# Altium footprint library ICs And Semiconductors SMD.PcbLib: 602 footprints (part 8 of 38)
Each footprint in its own frame and in the unit in brackets; x right, y up, seen from the top. Pads: shape width x height; smd on the part's side, far side on the other; paste and mask are expansions set on the pad; w line width, h text height; cw(c..) or ccw(c..) is an arc to the next point about the centre after c.
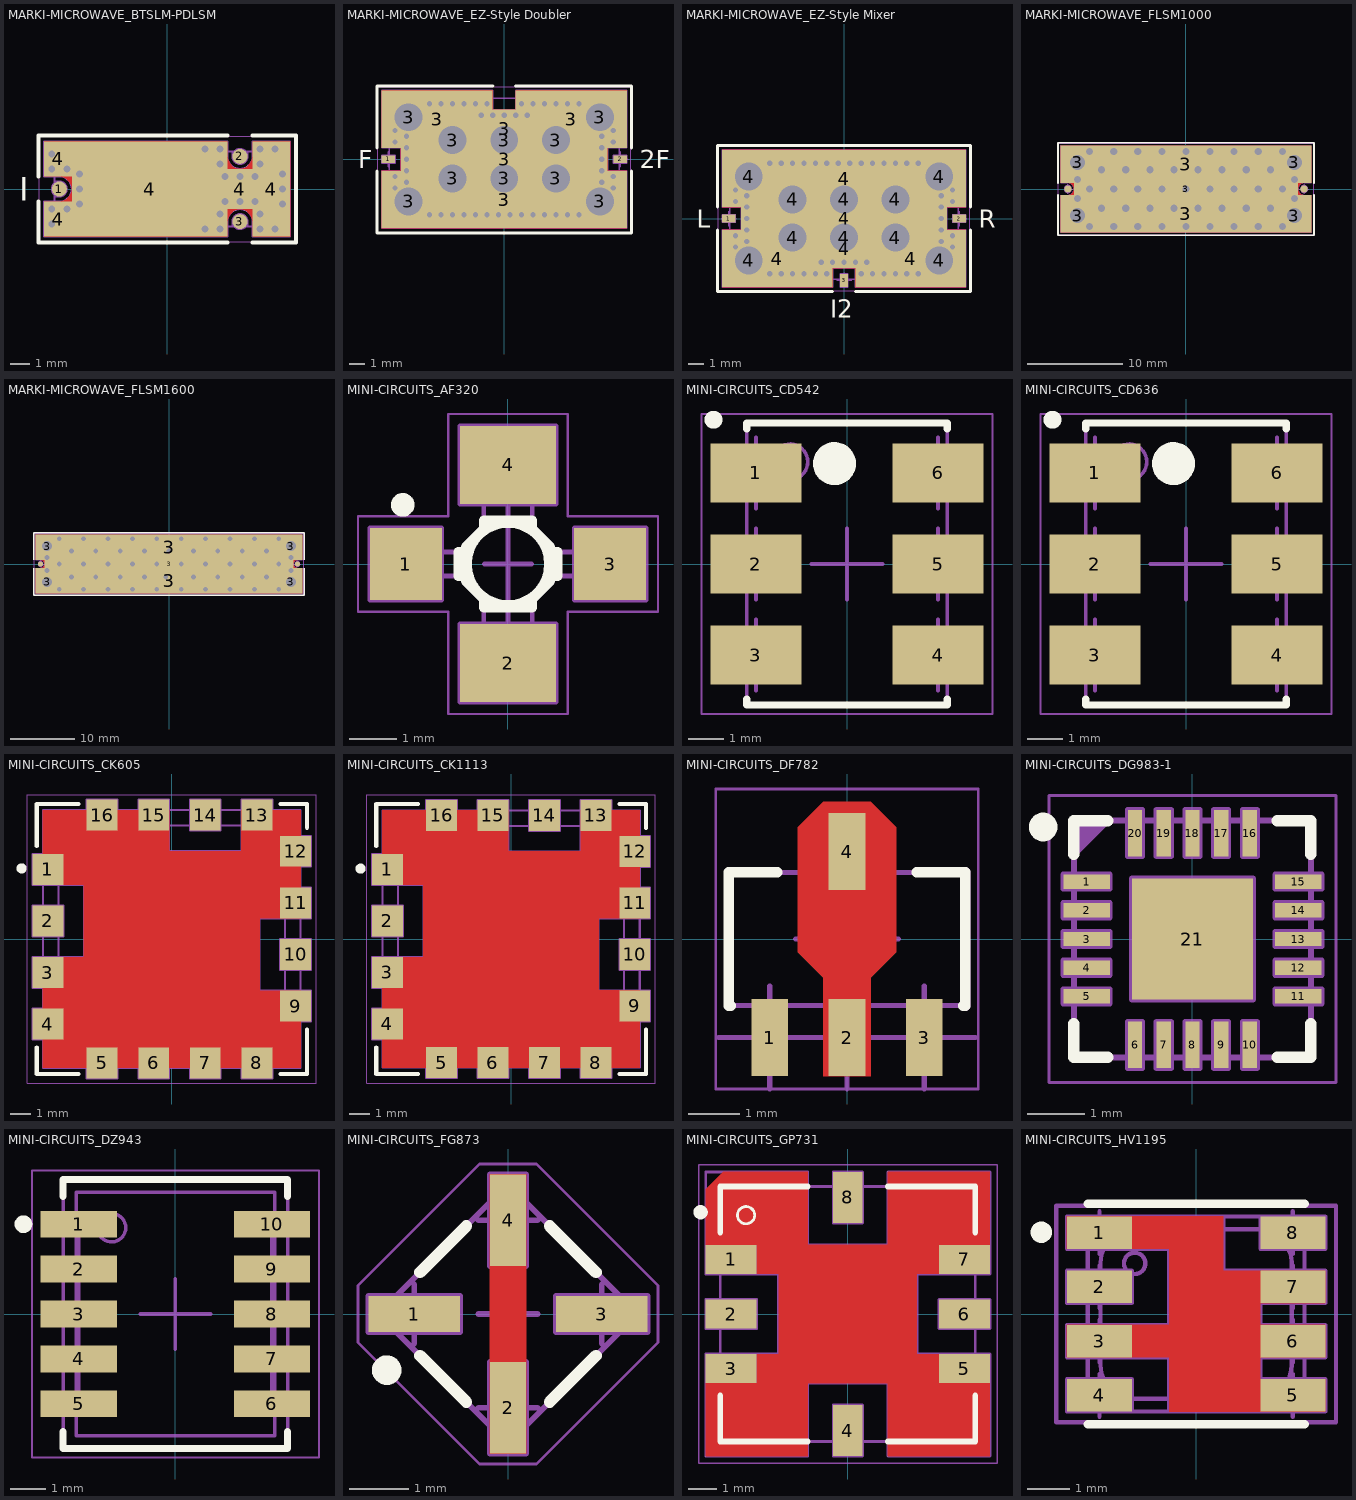
[diagram p7: the footprints below, top view; thin cyan lines are the x and y axes]

## MARKI-MICROWAVE_BTSLM-PDLSM [mil] "Marki microwave BTSLM-PDLSM Style, 11.43mm L X 3.81mm W X 2.79mm H Body"
height 169.29
pads (8):
  round 30 smd: 1(-215,0) 2(145.08,65) 3(145.08,-65)
  rect 54.96x70 smd: 4(-217.52,-59.98) 4(-217.52,60)
  rect 310.04x190 smd: 4(-35.02,0)
  rect 50x80.08 smd: 4(145,0)
  rect 74.96x190 smd: 4(207.51,-0.03)
via 75,80 diameter 23.62 hole 13.78
via 105,80 diameter 23.62 hole 13.78
via 105,50 diameter 23.62 hole 13.78
via 115,25 diameter 23.62 hole 13.78
via 145,25 diameter 23.62 hole 13.78
via 175,25 diameter 23.62 hole 13.78
via 185,50 diameter 23.62 hole 13.78
via 185,80 diameter 23.62 hole 13.78
via 215,80 diameter 23.62 hole 13.78
via 230,30 diameter 23.62 hole 13.78
via 230,0 diameter 23.62 hole 13.78
via 230,-30 diameter 23.62 hole 13.78
via 215,-80 diameter 23.62 hole 13.78
via 185,-80 diameter 23.62 hole 13.78
via 185,-50 diameter 23.62 hole 13.78
via 175,-25 diameter 23.62 hole 13.78
via 145,-25 diameter 23.62 hole 13.78
via 115,-25 diameter 23.62 hole 13.78
via 105,-50 diameter 23.62 hole 13.78
via 105,-80 diameter 23.62 hole 13.78
via 75,-80 diameter 23.62 hole 13.78
via -230,-70 diameter 23.62 hole 13.78
via -230,-40 diameter 23.62 hole 13.78
via -200,-40 diameter 23.62 hole 13.78
via -175,-30 diameter 23.62 hole 13.78
via -175,0 diameter 23.62 hole 13.78
via -175,30 diameter 23.62 hole 13.78
via -200,40 diameter 23.62 hole 13.78
via -230,40 diameter 23.62 hole 13.78
via -230,70 diameter 23.62 hole 13.78
Top Layer:
  region: -245,-24.96 -214.95,-24.96 -210.08,-24.48 -201.08,-20.75 -194.19,-13.87 -190.47,-4.87 -190.47,4.87 -194.19,13.87 -201.08,20.75 -210.08,24.48 -214.95,24.96 -225,24.96 -245,25 -245,95 120,95 120,65 120.48,60.12 124.22,51.11 131.11,44.21 140.12,40.48 149.88,40.48 158.89,44.21 165.79,51.11 169.52,60.12 170,65 170,95 245,95 245,-95 170.04,-95 170.04,-64.95 169.56,-60.08 165.83,-51.08 158.95,-44.2 149.95,-40.47 140.21,-40.47 131.21,-44.2 124.33,-51.08 120.6,-60.08 120.12,-64.95 120.12,-75 120,-95 -245,-95
Top Overlay:
  lines w7.87: -256.81,-24.96 -256.81,-106.81 120,-106.81 ; -256.81,25 -256.81,106.81 120,106.81 ; 170,106.81 256.81,106.81 256.81,-106.81 170.04,-106.81
  text "I" at -295.28,-23.62 h47.24
Mechanical 8:
  drawing of 170 lines, arcs and shapes, not listed
Mechanical 14:
  circle w3.94: c145.08,-65 r3.94
  circle w3.94: c145.08,65 r3.94
  circle w3.94: c218.11,62.99 r3.94
  circle w3.94: c218.11,0 r3.94
  circle w3.94: c218.11,-62.99 r3.94
  circle w3.94: c-215,0 r3.94
  lines w3.94: -225,-24.96 -214.95,-24.96 ccw(c-215,0) -214.95,24.96 -225,24.96 ; -225,-14.96 -214.96,-14.96 ccw(c-215,0) -214.96,14.96 -225,14.96 ; 120.12,-75 120.12,-64.95 cw(c145.08,-65) 170.04,-64.95 170.04,-75 ; 120.12,75 120,65 ccw(c145,65) 170,65 170,75 ; 130.12,-75 130.12,-64.96 cw(c145.08,-65) 160.04,-64.96 160.04,-75 ; 130.12,75 130.12,64.96 ccw(c145.08,65) 160.04,64.96 160.04,75 205,75 205,-75 ; -225,-75 225,-75 225,75 -225,75 -225,-75
  text "I" at -295.28,-23.62 h47.24
Mechanical 15:
  lines w1.97: -254.84,-104.84 254.84,-104.84 254.84,104.84 -254.84,104.84 -254.84,-104.84
Drill Drawing:
  lines w3.94: -245,-95 -245,95 245,95 245,-95 -245,-95
  text "Filled" at -145.67,59.06 h23.62
  text "Via Area" at -145.67,-23.62 h23.62
  text "And Capped" at -145.67,19.68 h23.62
  text "(D=0.35mm)" at -145.67,-62.99 h23.62
3D body "MARKI-MICROWAVE_BTSLM-PDLSM.stp": height 110, standoff 0, extent -224.99,-74.99 225.01,75

## MARKI-MICROWAVE_EZ-Style Doubler [mm] "Marki microwave EZ Style Doubler Outline, 15.24mm L X 8.13mm W X 4.3mm H Body"
height 4.3
pads (17):
  rect 0.889x0.508 smd: 1(-7.683,0) 2(7.684,0)
  round 2.35 hole 1.85: 3(-6.35,-2.794) 3(-6.35,2.794) 3(-3.429,-1.27) 3(-3.429,1.27) 3(0,-1.27) 3(0,1.27) 3(3.429,-1.27) 3(3.429,1.27) 3(6.35,-2.794) 3(6.35,2.794)
  rect 7.366x3.81 smd: 3(-4.445,2.667) 3(4.445,2.667)
  rect 16.256x3.81 smd: 3(0,-2.667)
  rect 13.716x1.524 smd: 3(0,0)
  rect 1.524x2.54 smd: 3(0,2.032)
via -6.477,1.524 diameter 0.6 hole 0.35
via -4.953,3.683 diameter 0.6 hole 0.35
via -4.191,3.683 diameter 0.6 hole 0.35
via -3.429,3.683 diameter 0.6 hole 0.35
via -2.667,3.683 diameter 0.6 hole 0.35
via -1.905,3.683 diameter 0.6 hole 0.35
via -1.143,3.683 diameter 0.6 hole 0.35
via -1.524,2.921 diameter 0.6 hole 0.35
via -0.762,2.921 diameter 0.6 hole 0.35
via 0,2.921 diameter 0.6 hole 0.35
via 0.762,2.921 diameter 0.6 hole 0.35
via 1.524,2.921 diameter 0.6 hole 0.35
via 1.143,3.683 diameter 0.6 hole 0.35
via 1.905,3.683 diameter 0.6 hole 0.35
via 2.667,3.683 diameter 0.6 hole 0.35
via 3.429,3.683 diameter 0.6 hole 0.35
via 4.191,3.683 diameter 0.6 hole 0.35
via 4.953,3.683 diameter 0.6 hole 0.35
via 7.239,1.905 diameter 0.6 hole 0.35
via 7.239,1.143 diameter 0.6 hole 0.35
via 6.477,1.524 diameter 0.6 hole 0.35
via 6.477,0.762 diameter 0.6 hole 0.35
via 6.477,0 diameter 0.6 hole 0.35
via 6.477,-0.762 diameter 0.6 hole 0.35
via 7.239,-1.143 diameter 0.6 hole 0.35
via 6.477,-1.524 diameter 0.6 hole 0.35
via 7.239,-1.905 diameter 0.6 hole 0.35
via 4.953,-3.683 diameter 0.6 hole 0.35
via 4.191,-3.683 diameter 0.6 hole 0.35
via 3.429,-3.683 diameter 0.6 hole 0.35
via 2.667,-3.683 diameter 0.6 hole 0.35
via 1.905,-3.683 diameter 0.6 hole 0.35
via 1.143,-3.683 diameter 0.6 hole 0.35
via 0.381,-3.683 diameter 0.6 hole 0.35
via -0.381,-3.683 diameter 0.6 hole 0.35
via -1.143,-3.683 diameter 0.6 hole 0.35
via -1.905,-3.683 diameter 0.6 hole 0.35
via -2.667,-3.683 diameter 0.6 hole 0.35
via -3.429,-3.683 diameter 0.6 hole 0.35
via -4.191,-3.683 diameter 0.6 hole 0.35
via -4.953,-3.683 diameter 0.6 hole 0.35
via -7.239,-1.905 diameter 0.6 hole 0.35
via -6.477,-1.524 diameter 0.6 hole 0.35
via -7.239,-1.143 diameter 0.6 hole 0.35
via -6.477,-0.762 diameter 0.6 hole 0.35
via -6.477,0 diameter 0.6 hole 0.35
via -6.477,0.762 diameter 0.6 hole 0.35
via -7.239,1.143 diameter 0.6 hole 0.35
via -7.239,1.905 diameter 0.6 hole 0.35
Top Layer:
  region: -8.128,-0.762 -6.858,-0.762 -6.858,0.762 -8.128,0.762 -8.128,4.572 -0.762,4.572 -0.762,3.302 0.762,3.302 0.762,4.572 8.128,4.572 8.128,0.762 6.858,0.762 6.858,-0.762 8.128,-0.762 8.128,-4.572 -8.128,-4.572
Top Overlay:
  lines w0.2: -8.428,-0.762 -8.428,-4.872 8.428,-4.872 8.428,-0.762 ; -8.428,0.762 -8.428,4.872 -0.762,4.872 ; 0.762,4.872 8.428,4.872 8.428,0.762
  text "2F" at 9,-0.6 h1.2
  text "F" at -9.7,-0.6 h1.2
Mechanical 8:
  drawing of 285 lines, arcs and shapes, not listed
Mechanical 14:
  circle w0.1: c6.35,2.794 r1.2
  circle w0.1: c-6.35,-2.794 r1.2
  circle w0.1: c6.35,-2.794 r0.925
  circle w0.1: c-6.35,2.794 r0.925
  lines w0.1: -7.62,-1.394 -7.62,-2.794 ccw(c-6.35,-2.794) -6.35,-4.064 -4.95,-4.064 ; -7.62,-1.394 -7.62,1.394 ; -7.62,-1.394 -6.35,-1.394 cw(c-6.35,-2.794) -4.95,-2.794 -4.95,-4.064 ; -7.62,1.394 -6.35,1.394 ccw(c-6.35,2.794) -4.95,2.794 -4.95,4.064 ; -7.62,1.394 -7.62,2.794 cw(c-6.35,2.794) -6.35,4.064 -4.95,4.064 ; -4.95,-4.064 4.95,-4.064 ; -4.95,4.064 4.95,4.064 ; 4.95,-4.064 4.95,-2.794 cw(c6.35,-2.794) 6.35,-1.394 7.62,-1.394 ; 4.95,-4.064 6.35,-4.064 ccw(c6.35,-2.794) 7.62,-2.794 7.62,-1.394 ; 4.95,4.064 6.35,4.064 cw(c6.35,2.794) 7.62,2.794 7.62,1.394 ; 4.95,4.064 4.95,2.794 ccw(c6.35,2.794) 6.35,1.394 7.62,1.394 ; 7.62,-1.394 7.62,1.394 ; -7.123,-3.24 -6.35,-3.686 -5.577,-3.24 -5.577,-2.348 -6.35,-1.902 -7.123,-2.348 -7.123,-3.24 ; 5.577,2.348 6.35,1.902 7.123,2.348 7.123,3.24 6.35,3.686 5.577,3.24 5.577,2.348
  text "F" at -9.7,-0.6 h1.2
  text "2F" at 9,-0.6 h1.2
Mechanical 15:
  lines w0.05: -8.378,-4.822 -8.378,4.822 8.378,4.822 8.378,-4.822 -8.378,-4.822
Drill Drawing:
  lines w0.1: -7.62,-4.064 -7.62,4.064 7.62,4.064 7.62,-4.064 -7.62,-4.064
  text "(D=0.35mm)" at -2.3,-3.1 h0.6
  text "Filled and Capped Via Area" at -7.5,4.4 h0.6
3D body "MARKI-MICROWAVE_EZ-Style Doubler.stp": height 4.3, standoff 0, extent -7.62,-4.064 7.62,4.064

## MARKI-MICROWAVE_EZ-Style Mixer [mm] "Marki microwave EZ Style Mixer Outline, 15.24mm L X 8.13mm W X 4.3mm H Body"
height 4.3
pads (18):
  rect 0.889x0.508 smd: 1(-7.683,0) 2(7.684,0)
  rect 0.508x0.889 smd: 3(0,-4.128)
  round 2.35 hole 1.85: 4(-6.35,-2.794) 4(-6.35,2.794) 4(-3.429,-1.27) 4(-3.429,1.27) 4(0,-1.27) 4(0,1.27) 4(3.429,-1.27) 4(3.429,1.27) 4(6.35,-2.794) 4(6.35,2.794)
  rect 7.366x3.81 smd: 4(-4.445,-2.667) 4(4.445,-2.667)
  rect 1.524x2.54 smd: 4(0,-2.032)
  rect 13.716x1.524 smd: 4(0,0)
  rect 16.256x3.81 smd: 4(0,2.667)
via -6.477,1.524 diameter 0.6 hole 0.35
via -7.239,1.905 diameter 0.6 hole 0.35
via -7.239,1.143 diameter 0.6 hole 0.35
via -6.477,0.762 diameter 0.6 hole 0.35
via -6.477,0 diameter 0.6 hole 0.35
via -6.477,-0.762 diameter 0.6 hole 0.35
via -7.239,-1.143 diameter 0.6 hole 0.35
via -6.477,-1.524 diameter 0.6 hole 0.35
via -7.239,-1.905 diameter 0.6 hole 0.35
via -4.953,-3.683 diameter 0.6 hole 0.35
via -4.191,-3.683 diameter 0.6 hole 0.35
via -3.429,-3.683 diameter 0.6 hole 0.35
via -2.667,-3.683 diameter 0.6 hole 0.35
via -1.905,-3.683 diameter 0.6 hole 0.35
via -1.143,-3.683 diameter 0.6 hole 0.35
via -1.524,-2.921 diameter 0.6 hole 0.35
via -0.762,-2.921 diameter 0.6 hole 0.35
via 0,-2.921 diameter 0.6 hole 0.35
via 0.762,-2.921 diameter 0.6 hole 0.35
via 1.524,-2.921 diameter 0.6 hole 0.35
via 1.143,-3.683 diameter 0.6 hole 0.35
via 1.905,-3.683 diameter 0.6 hole 0.35
via 2.667,-3.683 diameter 0.6 hole 0.35
via 3.429,-3.683 diameter 0.6 hole 0.35
via 4.191,-3.683 diameter 0.6 hole 0.35
via 4.953,-3.683 diameter 0.6 hole 0.35
via 7.239,-1.905 diameter 0.6 hole 0.35
via 6.477,-1.524 diameter 0.6 hole 0.35
via 7.239,-1.143 diameter 0.6 hole 0.35
via 6.477,-0.762 diameter 0.6 hole 0.35
via 6.477,0 diameter 0.6 hole 0.35
via 6.477,0.762 diameter 0.6 hole 0.35
via 6.477,1.524 diameter 0.6 hole 0.35
via 7.239,1.143 diameter 0.6 hole 0.35
via 7.239,1.905 diameter 0.6 hole 0.35
via 4.953,3.683 diameter 0.6 hole 0.35
via 4.191,3.683 diameter 0.6 hole 0.35
via 3.429,3.683 diameter 0.6 hole 0.35
via 2.667,3.683 diameter 0.6 hole 0.35
via 1.905,3.683 diameter 0.6 hole 0.35
via 1.143,3.683 diameter 0.6 hole 0.35
via -1.143,3.683 diameter 0.6 hole 0.35
via -1.905,3.683 diameter 0.6 hole 0.35
via -2.667,3.683 diameter 0.6 hole 0.35
via -3.429,3.683 diameter 0.6 hole 0.35
via -4.191,3.683 diameter 0.6 hole 0.35
via -4.953,3.683 diameter 0.6 hole 0.35
via -0.381,3.683 diameter 0.6 hole 0.35
via 0.381,3.683 diameter 0.6 hole 0.35
Top Layer:
  region: -8.128,-4.572 -8.128,-0.762 -6.858,-0.762 -6.858,0.762 -8.128,0.762 -8.128,4.572 8.128,4.572 8.128,0.762 6.858,0.762 6.858,-0.762 8.128,-0.762 8.128,-4.572 0.762,-4.572 0.762,-3.302 -0.762,-3.302 -0.762,-4.572
Top Overlay:
  lines w0.2: -8.428,-0.762 -8.428,-4.872 -0.762,-4.872 ; -8.428,0.762 -8.428,4.872 8.428,4.872 8.428,0.762 ; 0.762,-4.872 8.428,-4.872 8.428,-0.762
  text "R" at 9,-0.6 h1.2
  text "L" at -9.8,-0.6 h1.2
  text "I2" at -0.9,-6.6 h1.2
Mechanical 8:
  drawing of 293 lines, arcs and shapes, not listed
Mechanical 14:
  circle w0.1: c-6.35,2.794 r0.925
  circle w0.1: c6.35,-2.794 r0.925
  circle w0.1: c-6.35,-2.794 r1.2
  circle w0.1: c6.35,2.794 r1.2
  lines w0.1: -7.62,-1.394 -6.35,-1.394 cw(c-6.35,-2.794) -4.95,-2.794 -4.95,-4.064 ; -7.62,-1.394 -7.62,1.394 ; -7.62,-1.394 -7.62,-2.794 ccw(c-6.35,-2.794) -6.35,-4.064 -4.95,-4.064 ; -7.62,1.394 -7.62,2.794 cw(c-6.35,2.794) -6.35,4.064 -4.95,4.064 ; -7.62,1.394 -6.35,1.394 ccw(c-6.35,2.794) -4.95,2.794 -4.95,4.064 ; -4.95,-4.064 4.95,-4.064 ; -4.95,4.064 4.95,4.064 ; 4.95,-4.064 6.35,-4.064 ccw(c6.35,-2.794) 7.62,-2.794 7.62,-1.394 ; 4.95,-4.064 4.95,-2.794 cw(c6.35,-2.794) 6.35,-1.394 7.62,-1.394 ; 4.95,4.064 4.95,2.794 ccw(c6.35,2.794) 6.35,1.394 7.62,1.394 ; 4.95,4.064 6.35,4.064 cw(c6.35,2.794) 7.62,2.794 7.62,1.394 ; 7.62,-1.394 7.62,1.394 ; -7.123,-3.24 -7.123,-2.348 -6.35,-1.902 -5.577,-2.348 -5.577,-3.24 -6.35,-3.686 -7.123,-3.24 ; 5.577,2.348 5.577,3.24 6.35,3.686 7.123,3.24 7.123,2.348 6.35,1.902 5.577,2.348
  text "L" at -9.8,-0.6 h1.2
  text "R" at 9,-0.6 h1.2
  text "I2" at -0.9,-6.6 h1.2
Mechanical 15:
  lines w0.05: -8.378,-4.822 8.378,-4.822 8.378,4.822 -8.378,4.822 -8.378,-4.822
Drill Drawing:
  lines w0.1: -7.62,-4.064 7.62,-4.064 7.62,4.064 -7.62,4.064 -7.62,-4.064
  text "(D=0.35mm)" at -2.8,2.6 h0.6
  text "Filled and Capped Via Area" at -7.5,4.4 h0.6
3D body "MARKI-MICROWAVE_EZ-Style Mixer.stp": height 4.3, standoff 0, extent -7.62,-4.064 7.62,4.064

## MARKI-MICROWAVE_FLSM1000 [mm] "Marki microwave Case FLSM1000, 25.4mm L X 8.13mm W X 2.794mm H Body"
height 2.794
pads (9):
  round 0.762 smd: 1(-12.446,0) 2(12.446,0)
  round 2.3 hole 1.6: 3(-11.43,-2.795) 3(-11.43,2.795) 3(11.43,-2.795) 3(11.43,2.795)
  rect 26.416x3.937 smd: 3(0,-2.604) 3(0,2.604)
  rect 23.622x1.27 smd: 3(0,0)
via 10.16,-3.937 diameter 1.05 hole 0.75
via 7.62,-3.937 diameter 1.05 hole 0.75
via 5.08,-3.937 diameter 1.05 hole 0.75
via 2.54,-3.937 diameter 1.05 hole 0.75
via 0,-3.937 diameter 1.05 hole 0.75
via -2.54,-3.937 diameter 1.05 hole 0.75
via -5.08,-3.937 diameter 1.05 hole 0.75
via -7.62,-3.937 diameter 1.05 hole 0.75
via -10.16,-3.937 diameter 1.05 hole 0.75
via -11.43,-1.016 diameter 1.05 hole 0.75
via -8.89,-2.032 diameter 1.05 hole 0.75
via -6.35,-2.032 diameter 1.05 hole 0.75
via -3.81,-2.032 diameter 1.05 hole 0.75
via -1.27,-2.032 diameter 1.05 hole 0.75
via 1.27,-2.032 diameter 1.05 hole 0.75
via 3.81,-2.032 diameter 1.05 hole 0.75
via 6.35,-2.032 diameter 1.05 hole 0.75
via 8.89,-2.032 diameter 1.05 hole 0.75
via 11.43,-1.016 diameter 1.05 hole 0.75
via 11.43,1.016 diameter 1.05 hole 0.75
via 10.16,0 diameter 1.05 hole 0.75
via 7.62,0 diameter 1.05 hole 0.75
via 5.08,0 diameter 1.05 hole 0.75
via 2.54,0 diameter 1.05 hole 0.75
via 0,0 diameter 1.05 hole 0.75
via -2.54,0 diameter 1.05 hole 0.75
via -5.08,0 diameter 1.05 hole 0.75
via -7.62,0 diameter 1.05 hole 0.75
via -10.16,0 diameter 1.05 hole 0.75
via -11.43,1.016 diameter 1.05 hole 0.75
via -8.89,2.032 diameter 1.05 hole 0.75
via -6.35,2.032 diameter 1.05 hole 0.75
via -3.81,2.032 diameter 1.05 hole 0.75
via -1.27,2.032 diameter 1.05 hole 0.75
via 1.27,2.032 diameter 1.05 hole 0.75
via 3.81,2.032 diameter 1.05 hole 0.75
via 6.35,2.032 diameter 1.05 hole 0.75
via 8.89,2.032 diameter 1.05 hole 0.75
via 10.16,3.937 diameter 1.05 hole 0.75
via 7.62,3.937 diameter 1.05 hole 0.75
via 5.08,3.937 diameter 1.05 hole 0.75
via 2.54,3.937 diameter 1.05 hole 0.75
via 0,3.937 diameter 1.05 hole 0.75
via -2.54,3.937 diameter 1.05 hole 0.75
via -5.08,3.937 diameter 1.05 hole 0.75
via -7.62,3.937 diameter 1.05 hole 0.75
via -10.16,3.937 diameter 1.05 hole 0.75
Top Layer:
  region: -13.208,-4.572 -13.208,-0.635 -12.446,-0.635 -12.322,-0.623 -12.093,-0.528 -11.918,-0.353 -11.823,-0.124 -11.823,0.124 -11.918,0.353 -12.093,0.528 -12.322,0.623 -12.446,0.635 -13.208,0.635 -13.208,4.572 13.208,4.572 13.208,0.635 12.446,0.635 12.322,0.623 12.093,0.528 11.918,0.353 11.823,0.124 11.823,-0.124 11.918,-0.353 12.093,-0.528 12.322,-0.623 12.446,-0.635 13.208,-0.635 13.208,-4.572
Top Overlay:
  lines w0.2: -13.508,-0.635 -13.508,-4.872 13.508,-4.872 13.508,-0.635 ; -13.508,0.635 -13.508,4.872 13.508,4.872 13.508,0.635
Mechanical 8:
  drawing of 231 lines, arcs and shapes, not listed
Mechanical 14:
  circle w0.1: c-11.43,2.795 r0.762
  circle w0.1: c-11.43,-2.795 r0.762
  circle w0.1: c11.43,-2.795 r0.762
  circle w0.1: c11.43,2.795 r0.762
  lines w0.1: -12.7,-3.465 ccw(c-12.1,-3.465) -12.1,-4.065 12.1,-4.065 ccw(c12.1,-3.465) 12.7,-3.465 12.7,-0.635 12.446,-0.635 cw(c12.446,0) 12.446,0.635 12.7,0.635 12.7,3.465 ccw(c12.1,3.465) 12.1,4.065 -12.1,4.065 ccw(c-12.1,3.465) -12.7,3.465 -12.7,0.635 -12.446,0.635 cw(c-12.446,0) -12.446,-0.635 -12.7,-0.635 -12.7,-3.465
Mechanical 15:
  lines w0.05: -13.458,-4.822 -13.458,4.822 13.458,4.822 13.458,-4.822 -13.458,-4.822
Drill Drawing:
  lines w0.1: -13.208,-4.572 13.208,-4.572 13.208,4.572 -13.208,4.572 -13.208,-4.572
  text "Filled and Capped Via (0.75mm) Area" at -10.1,2.7 h0.6
3D body "MARKI-MICROWAVE_FLSM1000.stp": height 2.79, standoff 0, extent -12.7,-4.065 12.7,4.065

## MARKI-MICROWAVE_FLSM1600 [mm] "Marki microwave Case FLSM1600, 40.64mm L X 8.13mm W X 2.794mm H Body"
height 2.794
pads (9):
  round 0.762 smd: 1(-20.066,0) 2(20.066,0)
  round 2.3 hole 1.6: 3(-19.05,-2.795) 3(-19.05,2.795) 3(19.05,-2.795) 3(19.05,2.795)
  rect 41.656x3.937 smd: 3(0,-2.604) 3(0,2.604)
  rect 38.883x1.27 smd: 3(0,0)
via -17.145,3.937 diameter 1.05 hole 0.75
via -13.335,3.937 diameter 1.05 hole 0.75
via -9.525,3.937 diameter 1.05 hole 0.75
via -5.715,3.937 diameter 1.05 hole 0.75
via -1.905,3.937 diameter 1.05 hole 0.75
via 1.905,3.937 diameter 1.05 hole 0.75
via 5.715,3.937 diameter 1.05 hole 0.75
via 9.525,3.937 diameter 1.05 hole 0.75
via 13.335,3.937 diameter 1.05 hole 0.75
via 17.145,3.937 diameter 1.05 hole 0.75
via 19.05,1.016 diameter 1.05 hole 0.75
via 15.24,2.032 diameter 1.05 hole 0.75
via 11.43,2.032 diameter 1.05 hole 0.75
via 7.62,2.032 diameter 1.05 hole 0.75
via 3.81,2.032 diameter 1.05 hole 0.75
via 0,2.032 diameter 1.05 hole 0.75
via -3.81,2.032 diameter 1.05 hole 0.75
via -7.62,2.032 diameter 1.05 hole 0.75
via -11.43,2.032 diameter 1.05 hole 0.75
via -15.24,2.032 diameter 1.05 hole 0.75
via -19.05,1.016 diameter 1.05 hole 0.75
via -19.05,-1.016 diameter 1.05 hole 0.75
via -17.145,0 diameter 1.05 hole 0.75
via -13.335,0 diameter 1.05 hole 0.75
via -9.525,0 diameter 1.05 hole 0.75
via -5.715,0 diameter 1.05 hole 0.75
via -1.905,0 diameter 1.05 hole 0.75
via 1.905,0 diameter 1.05 hole 0.75
via 5.715,0 diameter 1.05 hole 0.75
via 9.525,0 diameter 1.05 hole 0.75
via 13.335,0 diameter 1.05 hole 0.75
via 17.145,0 diameter 1.05 hole 0.75
via 19.05,-1.016 diameter 1.05 hole 0.75
via 15.24,-2.032 diameter 1.05 hole 0.75
via 11.43,-2.032 diameter 1.05 hole 0.75
via 7.62,-2.032 diameter 1.05 hole 0.75
via 3.81,-2.032 diameter 1.05 hole 0.75
via -0.5,-2.032 diameter 1.05 hole 0.75
via -3.81,-2.032 diameter 1.05 hole 0.75
via -7.62,-2.032 diameter 1.05 hole 0.75
via -11.43,-2.032 diameter 1.05 hole 0.75
via -15.24,-2.032 diameter 1.05 hole 0.75
via -17.145,-3.937 diameter 1.05 hole 0.75
via -13.335,-3.937 diameter 1.05 hole 0.75
via -9.525,-3.937 diameter 1.05 hole 0.75
via -5.715,-3.937 diameter 1.05 hole 0.75
via -1.905,-3.937 diameter 1.05 hole 0.75
via 1.905,-3.937 diameter 1.05 hole 0.75
via 5.715,-3.937 diameter 1.05 hole 0.75
via 9.525,-3.937 diameter 1.05 hole 0.75
via 13.335,-3.937 diameter 1.05 hole 0.75
via 17.145,-3.937 diameter 1.05 hole 0.75
Top Layer:
  region: -20.828,-4.572 -20.828,-0.635 -20.066,-0.635 -19.942,-0.623 -19.713,-0.528 -19.538,-0.353 -19.443,-0.124 -19.443,0.124 -19.538,0.353 -19.713,0.528 -19.942,0.623 -20.066,0.635 -20.828,0.635 -20.828,4.572 20.828,4.572 20.828,0.635 20.066,0.635 19.942,0.623 19.713,0.528 19.538,0.353 19.443,0.124 19.443,-0.124 19.538,-0.353 19.713,-0.528 19.942,-0.623 20.066,-0.635 20.828,-0.635 20.828,-4.572
Top Overlay:
  lines w0.2: -21.128,-0.635 -21.128,-4.872 21.128,-4.872 21.128,-0.635 ; -21.128,0.635 -21.128,4.872 21.128,4.872 21.128,0.635
Mechanical 8:
  drawing of 256 lines, arcs and shapes, not listed
Mechanical 14:
  circle w0.1: c-19.05,2.795 r0.762
  circle w0.1: c-19.05,-2.795 r0.762
  circle w0.1: c19.05,-2.795 r0.762
  circle w0.1: c19.05,2.795 r0.762
  lines w0.1: -20.32,-3.465 ccw(c-19.72,-3.465) -19.72,-4.065 19.72,-4.065 ccw(c19.72,-3.465) 20.32,-3.465 20.32,-0.635 20.066,-0.635 cw(c20.066,0) 20.066,0.635 20.32,0.635 20.32,3.465 ccw(c19.72,3.465) 19.72,4.065 -19.72,4.065 ccw(c-19.72,3.465) -20.32,3.465 -20.32,0.635 -20.066,0.635 cw(c-20.066,0) -20.066,-0.635 -20.32,-0.635 -20.32,-3.465
Mechanical 15:
  lines w0.1: -21.078,-4.822 -21.078,4.822 21.078,4.822 21.078,-4.822 -21.078,-4.822
Drill Drawing:
  lines w0.1: -20.828,-4.572 20.828,-4.572 20.828,4.572 -20.828,4.572 -20.828,-4.572
  text "Filled and Capped Via (0.75mm) Area" at -10.1,2.7 h0.6
3D body "MARKI-MICROWAVE_FLSM1600.stp": height 2.79, standoff 0, extent -20.32,-4.065 20.32,4.065
